# Altium footprint library 集大电协1.2.PcbLib: 197 footprints (part 8 of 13)
Each footprint in its own frame and in the unit in brackets; x right, y up, seen from the top. Pads: shape width x height; smd on the part's side, far side on the other; paste and mask are expansions set on the pad; w line width, h text height; cw(c..) or ccw(c..) is an arc to the next point about the centre after c.
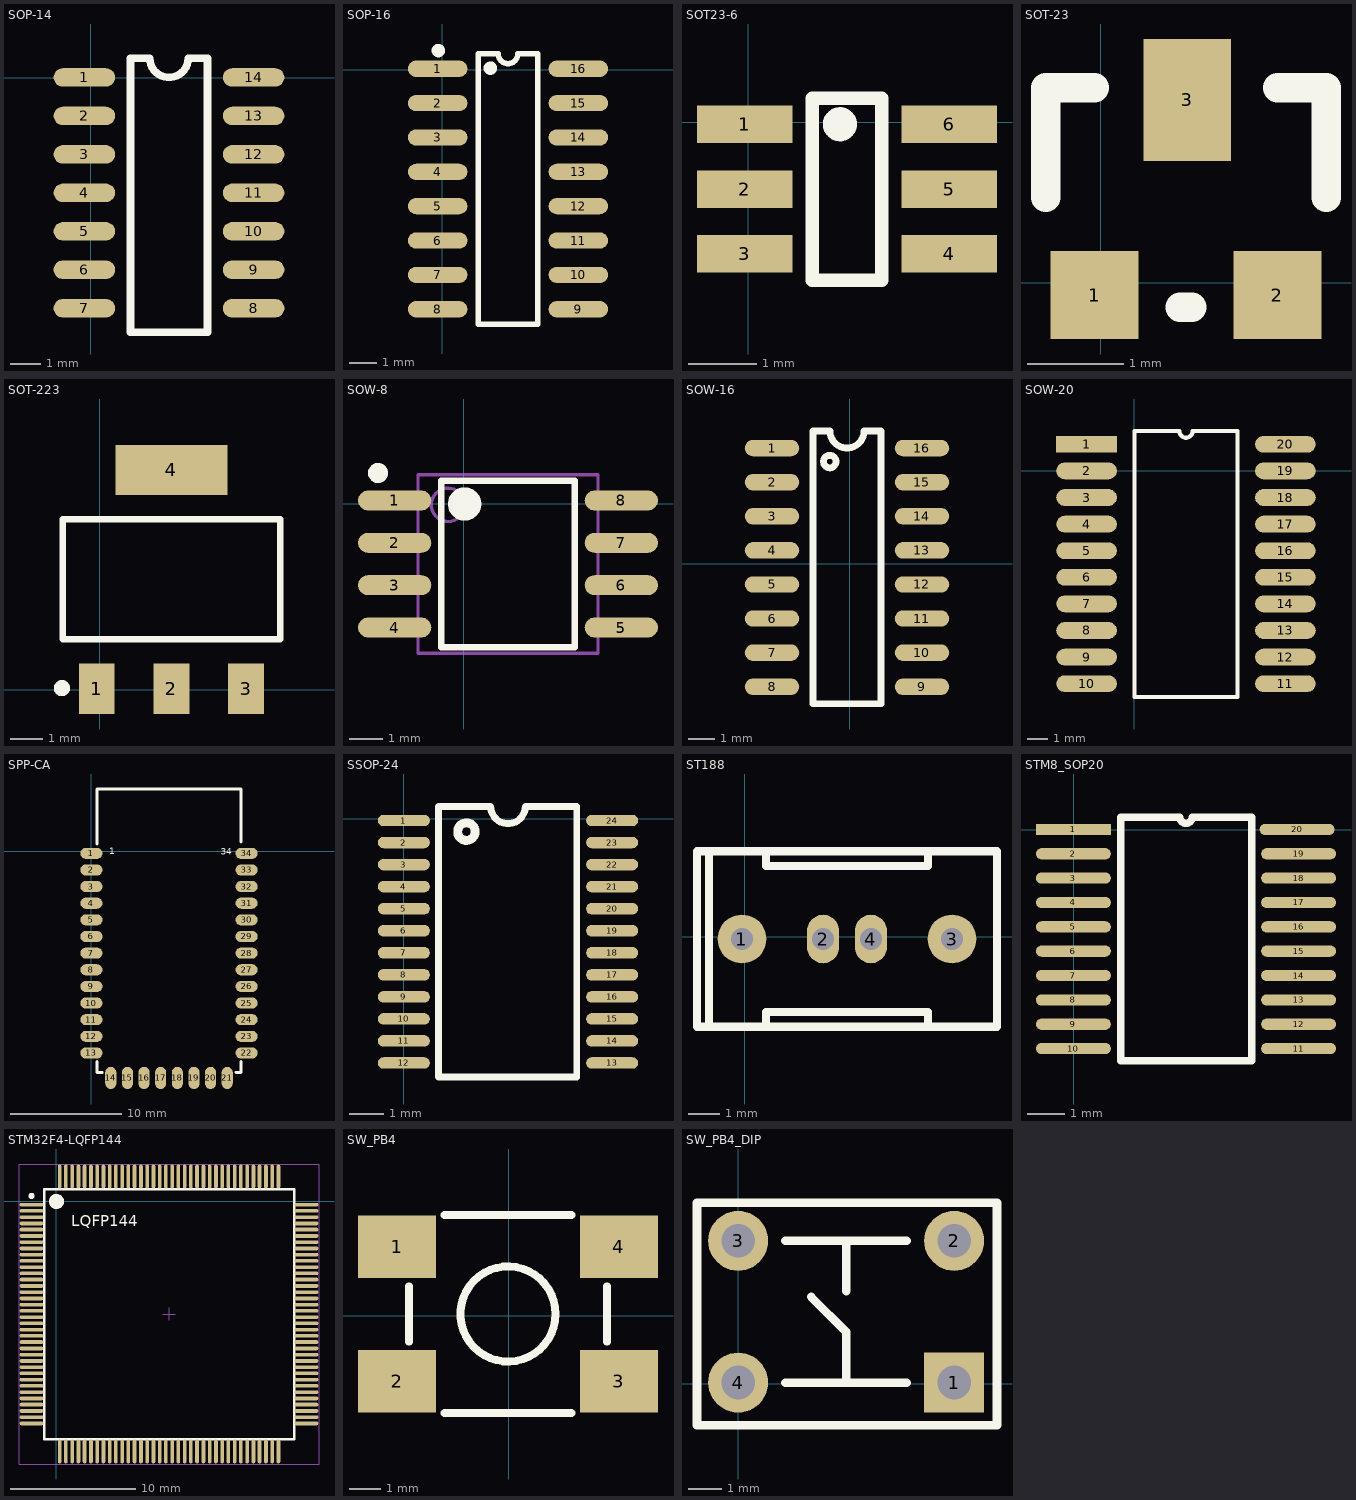
[diagram p7: the footprints below, top view; thin cyan lines are the x and y axes]

## SOP-14 [mil]
pads (14):
  oval 80x24 smd: 1(-8.54,0.68) 2(-8.54,-49.32) 3(-8.54,-99.32) 4(-8.54,-149.32) 5(-8.54,-199.32) 6(-8.54,-249.32) 7(-8.54,-299.32) 8(211.46,-299.32) 9(211.46,-249.32) 10(211.46,-199.32) 11(211.46,-149.32) 12(211.46,-99.32) 13(211.46,-49.32) 14(211.46,0.68)
Top Overlay:
  lines w10: 51.46,-330.71 51.46,25.68 76.46,25.68 ccw(c101.46,25.68) 126.46,25.68 151.46,25.68 151.46,-330.71 51.46,-330.71
3D body "User Library-SOP14-p127-780.STEP": height 43.31, standoff 0, extent -43.31,-349.41 244.09,52.16

## SOP-16 [mm]
pads (16):
  oval 2.2x0.6 smd: 1(-0.174,0.028) 2(-0.174,-1.242) 3(-0.174,-2.512) 4(-0.174,-3.782) 5(-0.174,-5.052) 6(-0.174,-6.322) 7(-0.174,-7.592) 8(-0.174,-8.862) 9(5.026,-8.862) 10(5.026,-7.592) 11(5.026,-6.322) 12(5.026,-5.052) 13(5.026,-3.782) 14(5.026,-2.512) 15(5.026,-1.242) 16(5.026,0.028)
Top Overlay:
  circle w0.25: c-0.15,0.7 r0.125
  circle w0.25: c1.775,0.05 r0.125
  lines w0.2: 1.326,-9.417 3.526,-9.417 3.526,0.583 2.793,0.583 cw(c2.426,0.583) 2.059,0.583 1.326,0.583 1.326,-9.417
3D body "SOP-16.STEP": height 1.4, standoff 0, extent -0.45,-9.4 5.55,0.5

## SOT23-6 [mm]
pads (6):
  rect 1.4x0.55 smd: 1(-0.051,-0.025) 2(-0.051,-0.975) 3(-0.051,-1.925) 4(2.949,-1.925) 5(2.949,-0.975) 6(2.949,-0.025)
Top Overlay:
  circle w0.25: c1.346,-0.025 r0.125
  lines w0.2: 0.941,-2.311 0.941,0.356 1.957,0.356 1.957,-2.311 0.941,-2.311
3D body "SOT23-6.STEP": height 1.15, standoff -0.03, extent 0.07,-2.467 2.877,0.533

## SOT-23 [mil]
pads (3):
  rect 36x36 smd: 1(-2.52,-5.16) 2(72.48,-5.16)
  rect 36x50 smd: 3(35.48,74.84)
Top Overlay:
  lines w12: -22.52,34.84 -22.52,79.84 -2.52,79.84 ; 32.48,-10.16 37.48,-10.16 ; 72.48,79.84 92.48,79.84 92.48,34.84
3D body "SOT-23-3.STEP": height 47.24, standoff 0, extent -22.08,-18.11 92.09,92.12

## SOT-223 [mm]
pads (4):
  rect 1.1x1.55 smd: 1(-0.09,0.029) 2(2.21,0.029) 3(4.51,0.029)
  rect 3.45x1.55 smd: 4(2.21,6.779)
Top Overlay:
  circle w0.25: c-1.166,0.051 r0.125
  lines w0.2: -1.14,1.554 -1.14,5.254 5.56,5.254 5.56,1.554 -1.14,1.554
3D body: height 0.8, standoff 0, extent -1.092,1.372 5.512,5.563
3D body: height 0.3, standoff 0, extent 0.559,5.563 3.861,6.833
3D body: height 0.3, standoff 0, extent -0.584,-0.533 0.305,1.372
3D body: height 0.3, standoff 0, extent 1.702,-0.533 2.591,1.372
3D body: height 0.3, standoff 0, extent 4.115,-0.533 5.004,1.372

## SOW-8 [mm]
pads (8):
  oval 2.2x0.6 smd: 1(-2.078,0.092) 2(-2.078,-1.178) 3(-2.078,-2.448) 4(-2.078,-3.718) 5(4.722,-3.718) 6(4.722,-2.448) 7(4.722,-1.178) 8(4.722,0.092)
Top Overlay:
  circle w0.3: c-2.578,0.917 r0.15
  circle w0.5: c0.022,-0.013 r0.25
  lines w0.2: -0.678,-4.313 3.322,-4.313 3.322,0.687 -0.678,0.687 -0.678,-4.313
Mechanical 13:
  circle w0.1: c-0.478,-0.038 r0.5
  lines w0.1: -1.378,-4.488 4.022,-4.488 4.022,0.862 -1.378,0.862 -1.378,-4.488
3D body "User Library-sop-8.STEP": height 1.6, standoff 0, extent -1.724,-4.349 4.318,0.671

## SOW-16 [mil]
pads (16):
  oval 80x24 smd: 1(-113.69,169.78) 2(-113.69,119.78) 3(-113.69,69.78) 4(-113.69,19.78) 5(-113.69,-30.22) 6(-113.69,-80.22) 7(-113.69,-130.22) 8(-113.69,-180.22) 9(106.31,-180.22) 10(106.31,-130.22) 11(106.31,-80.22) 12(106.31,-30.22) 13(106.31,19.78) 14(106.31,69.78) 15(106.31,119.78) 16(106.31,169.78)
Top Overlay:
  circle w10: c-29,150 r9.22
  lines w10: -53.69,-205.22 46.31,-205.22 46.31,194.78 21.31,194.78 cw(c-3.69,194.78) -28.69,194.78 -53.69,194.78 -53.69,-205.22
3D body "SOP-16.STEP": height 55.12, standoff 0, extent -122.1,-199.88 114.12,189.89

## SOW-20 [mm]
pads (20):
  rect 2.9x0.8 smd: 1(-2.286,1.27)
  oval 2.9x0.8 smd: 2(-2.286,0) 3(-2.286,-1.27) 4(-2.286,-2.54) 5(-2.286,-3.81) 6(-2.286,-5.08) 7(-2.286,-6.35) 8(-2.286,-7.62) 9(-2.286,-8.89) 10(-2.286,-10.16) 11(7.214,-10.16) 12(7.214,-8.89) 13(7.214,-7.62) 14(7.214,-6.35) 15(7.214,-5.08) 16(7.214,-3.81) 17(7.214,-2.54) 18(7.214,-1.27) 19(7.214,0) 20(7.214,1.27)
Top Overlay:
  lines w0.2: -0.001,-10.795 -0.001,1.905 2.146,1.905 ccw(c2.464,1.905) 2.781,1.905 4.929,1.905 4.929,-10.795 -0.001,-10.795
3D body: height 2.54, standoff 0, extent -2.349,-10.477 7.493,1.715
3D body: height 2.67, standoff 2.54, extent -0.634,-0.635 0.635,0.635

## SPP-CA [mm]
pads (34):
  oval 2x1 smd: 1(0.013,-0.174) 2(0.013,-1.674) 3(0.013,-3.174) 4(0.013,-4.674) 5(0.013,-6.174) 6(0.013,-7.674) 7(0.013,-9.174) 8(0.013,-10.674) 9(0.013,-12.174) 10(0.013,-13.674) 11(0.013,-15.174) 12(0.013,-16.674) 13(0.013,-18.174) 22(14.013,-18.174) 23(14.013,-16.674) 24(14.013,-15.174) 25(14.013,-13.674) 26(14.013,-12.174) 27(14.013,-10.674) 28(14.013,-9.174) 29(14.013,-7.674) 30(14.013,-6.174) 31(14.013,-4.674) 32(14.013,-3.174) 33(14.013,-1.674) 34(14.013,-0.174)
  oval 1x2 smd: 14(1.763,-20.424) 15(3.263,-20.424) 16(4.763,-20.424) 17(6.263,-20.424) 18(7.763,-20.424) 19(9.263,-20.424) 20(10.763,-20.424) 21(12.263,-20.424)
Top Overlay:
  lines w0.254: 0.513,0.652 0.513,5.623 10.934,5.623 13.513,5.623 13.513,0.855 ; 0.52,-18.957 0.513,-18.964 0.513,-19.924 1.002,-19.924 ; 13.067,-19.922 13.069,-19.924 13.513,-19.924 ; 13.513,-19.897 13.513,-18.932
  text "1" at 1.637,-0.491 h1
  text "34" at 11.67,-0.542 h1

## SSOP-24 [mm]
pads (24):
  oval 1.5x0.33 smd: 1(0,-0.057) 2(0,-0.692) 3(0,-1.327) 4(0,-1.962) 5(0,-2.597) 6(0,-3.232) 7(0,-3.867) 8(0,-4.502) 9(0,-5.137) 10(0,-5.772) 11(0,-6.407) 12(0,-7.042) 13(6,-7.042) 14(6,-6.407) 15(6,-5.772) 16(6,-5.137) 17(6,-4.502) 18(6,-3.867) 19(6,-3.232) 20(6,-2.597) 21(6,-1.962) 22(6,-1.327) 23(6,-0.692) 24(6,-0.057)
Top Overlay:
  circle w0.254: c1.803,-0.378 r0.254
  lines w0.2: 0.993,-7.45 4.981,-7.45 4.981,0.35 3.5,0.35 cw(c3,0.35) 2.5,0.35 0.993,0.35 0.993,-7.45
3D body: height 2.27, standoff 0.37, extent -0.975,-7.825 6.925,0.575

## ST188 [mm]
pads (4):
  round 1.524 hole 0.7: 1(-0.084,-0.07) 3(6.496,-0.07)
  oval 1x1.524 hole 0.7: 2(2.456,-0.07) 4(3.956,-0.07)
Top Overlay:
  lines w0.254: -1.112,-2.82 -1.112,2.68 ; 0.666,-2.82 0.666,-2.356 5.746,-2.356 5.746,-2.82 ; 0.666,2.68 0.666,2.216 5.746,2.216 5.746,2.68 ; -1.494,-2.82 -1.494,2.68 7.906,2.68 7.906,-2.82 -1.494,-2.82
3D body "User Library-ST 188.step": height 8.2, standoff -15.05, extent -1.249,-2.489 7.751,2.511

## STM8_SOP20 [mm]
pads (20):
  rect 2x0.3 smd: 1(-0.014,0.005)
  oval 2x0.3 smd: 2(-0.014,-0.645) 3(-0.014,-1.295) 4(-0.014,-1.945) 5(-0.014,-2.595) 6(-0.014,-3.245) 7(-0.014,-3.895) 8(-0.014,-4.545) 9(-0.014,-5.195) 10(-0.014,-5.845) 11(5.994,-5.845) 12(5.994,-5.195) 13(5.994,-4.545) 14(5.994,-3.895) 15(5.994,-3.245) 16(5.994,-2.595) 17(5.994,-1.945) 18(5.994,-1.295) 19(5.994,-0.645) 20(5.955,0.005)
Top Overlay:
  lines w0.2: 1.245,-6.17 1.245,0.33 2.828,0.33 ccw(c2.99,0.33) 3.153,0.33 4.75,0.33 4.75,-6.17 1.245,-6.17
3D body: height 1.1, standoff -0.09, extent -0.159,-6.273 6.121,0.227

## STM32F4-LQFP144 [mm]
pads (144):
  oval 1.905x0.3 smd: 1(-1.98,-0.262) 2(-1.98,-0.762) 3(-1.98,-1.262) 4(-1.98,-1.762) 5(-1.98,-2.262) 6(-1.98,-2.762) 7(-1.98,-3.262) 8(-1.98,-3.762) 9(-1.98,-4.262) 10(-1.98,-4.762) 11(-1.98,-5.262) 12(-1.98,-5.762) 13(-1.98,-6.262) 14(-1.98,-6.762) 15(-1.98,-7.262) 16(-1.98,-7.762) 17(-1.98,-8.262) 18(-1.98,-8.762) 19(-1.98,-9.262) 20(-1.98,-9.762) 21(-1.98,-10.262) 22(-1.98,-10.762) 23(-1.98,-11.262) 24(-1.98,-11.762) 25(-1.98,-12.262) 26(-1.98,-12.762) 27(-1.98,-13.262) 28(-1.98,-13.762) 29(-1.98,-14.262) 30(-1.98,-14.762) 31(-1.98,-15.262) 32(-1.98,-15.762) 33(-1.98,-16.262) 34(-1.98,-16.762) 35(-1.98,-17.262) 36(-1.98,-17.762) 73(20.02,-17.762) 74(20.02,-17.262) 75(20.02,-16.762) 76(20.02,-16.262) 77(20.02,-15.762) 78(20.02,-15.262) 79(20.02,-14.762) 80(20.02,-14.262) 81(20.02,-13.762) 82(20.02,-13.262) 83(20.02,-12.762) 84(20.02,-12.262) 85(20.02,-11.762) 86(20.02,-11.262) 87(20.02,-10.762) 88(20.02,-10.262) 89(20.02,-9.762) 90(20.02,-9.262) 91(20.02,-8.762) 92(20.02,-8.262) 93(20.02,-7.762) 94(20.02,-7.262) 95(20.02,-6.762) 96(20.02,-6.262) 97(20.02,-5.762) 98(20.02,-5.262) 99(20.02,-4.762) 100(20.02,-4.262) 101(20.02,-3.762) 102(20.02,-3.262) 103(20.02,-2.762) 104(20.02,-2.262) 105(20.02,-1.762) 106(20.02,-1.262) 107(20.02,-0.762) 108(20.02,-0.262)
  oval 0.3x1.905 smd: 37(0.27,-20.012) 38(0.77,-20.012) 39(1.27,-20.012) 40(1.77,-20.012) 41(2.27,-20.012) 42(2.77,-20.012) 43(3.27,-20.012) 44(3.77,-20.012) 45(4.27,-20.012) 46(4.77,-20.012) 47(5.27,-20.012) 48(5.77,-20.012) 49(6.27,-20.012) 50(6.77,-20.012) 51(7.27,-20.012) 52(7.77,-20.012) 53(8.27,-20.012) 54(8.77,-20.012) 55(9.27,-20.012) 56(9.77,-20.012) 57(10.27,-20.012) 58(10.77,-20.012) 59(11.27,-20.012) 60(11.77,-20.012) 61(12.27,-20.012) 62(12.77,-20.012) 63(13.27,-20.012) 64(13.77,-20.012) 65(14.27,-20.012) 66(14.77,-20.012) 67(15.27,-20.012) 68(15.77,-20.012) 69(16.27,-20.012) 70(16.77,-20.012) 71(17.27,-20.012) 72(17.77,-20.012) 109(17.77,1.988) 110(17.27,1.988) 111(16.77,1.988) 112(16.27,1.988) 113(15.77,1.988) 114(15.27,1.988) 115(14.77,1.988) 116(14.27,1.988) 117(13.77,1.988) 118(13.27,1.988) 119(12.77,1.988) 120(12.27,1.988) 121(11.77,1.988) 122(11.27,1.988) 123(10.77,1.988) 124(10.27,1.988) 125(9.77,1.988) 126(9.27,1.988) 127(8.77,1.988) 128(8.27,1.988) 129(7.77,1.988) 130(7.27,1.988) 131(6.77,1.988) 132(6.27,1.988) 133(5.77,1.988) 134(5.27,1.988) 135(4.77,1.988) 136(4.27,1.988) 137(3.77,1.988) 138(3.27,1.988) 139(2.77,1.988) 140(2.27,1.988) 141(1.77,1.988) 142(1.27,1.988) 143(0.77,1.988) 144(0.27,1.988)
Top Overlay:
  circle w0.25: c-1.98,0.438 r0.125
  circle w0.6: c0.02,-0.012 r0.3
  lines w0.2: -0.98,-19.012 -0.98,0.988 19.02,0.988 19.02,-19.012 -0.98,-19.012
  text "LQFP144" at 1.2,-2.3 h1.52
Mechanical 13:
  circle w0.1: c-0.03,0.038 r0.5
  lines w0.1: -0.98,-19.012 -0.98,0.988 19.02,0.988 19.02,-19.012 -0.98,-19.012
Mechanical 15:
  lines w0.1: 8.52,-9.012 9.52,-9.012 ; 9.02,-9.512 9.02,-8.512 ; -2.98,-21.012 -2.98,2.988 21.02,2.988 21.02,-21.012 -2.98,-21.012
3D body: height 1.6, standoff 0.25, extent -0.98,-19.012 19.02,0.988

## STM32F405RGT6 [mm] "STM32F405RGT6"

## SW_PB4 [mm]
pads (4):
  rect 2.5x2 smd: 1(-3.581,2.21) 2(-3.581,-2.108) 3(3.531,-2.108) 4(3.531,2.21)
Top Overlay:
  circle w0.254: c-0.025,0.051 r1.524
  lines w0.25: -3.2,-0.838 -3.2,0.94 ; -2.057,-3.124 2.007,-3.124 ; -2.057,3.226 2.007,3.226 ; 3.15,-0.838 3.15,0.94
3D body: height 6, standoff 0, extent -1.549,-1.473 1.499,1.575
3D body: height 1.5, standoff 0, extent -3.2,-3.124 3.15,3.226

## SW_PB4_DIP [mil]
pads (4):
  rect 70x70 hole 39.37: 1(251.98,1.32)
  round 70 hole 39.37: 2(251.98,166.68) 3(0.02,166.68) 4(0.02,1.32)
Top Overlay:
  lines w10: 55.13,1.32 196.87,1.32 ; 55.13,166.68 196.87,166.68 ; 85.06,101.32 126,60.38 126,1.32 ; 126,107.62 126,166.68 ; -48.02,-48.68 301.98,-48.68 301.98,211.32 -48.02,211.32 -48.02,-48.68
3D body: height 314.96, standoff -137.8, extent -37,-48.95 288.48,206.95